# Altium footprint library 1.03-电容.PcbLib: 224 footprints (part 11 of 14)
Each footprint in its own frame and in the unit in brackets; x right, y up, seen from the top. Pads: shape width x height; smd on the part's side, far side on the other; paste and mask are expansions set on the pad; w line width, h text height; cw(c..) or ccw(c..) is an arc to the next point about the centre after c.
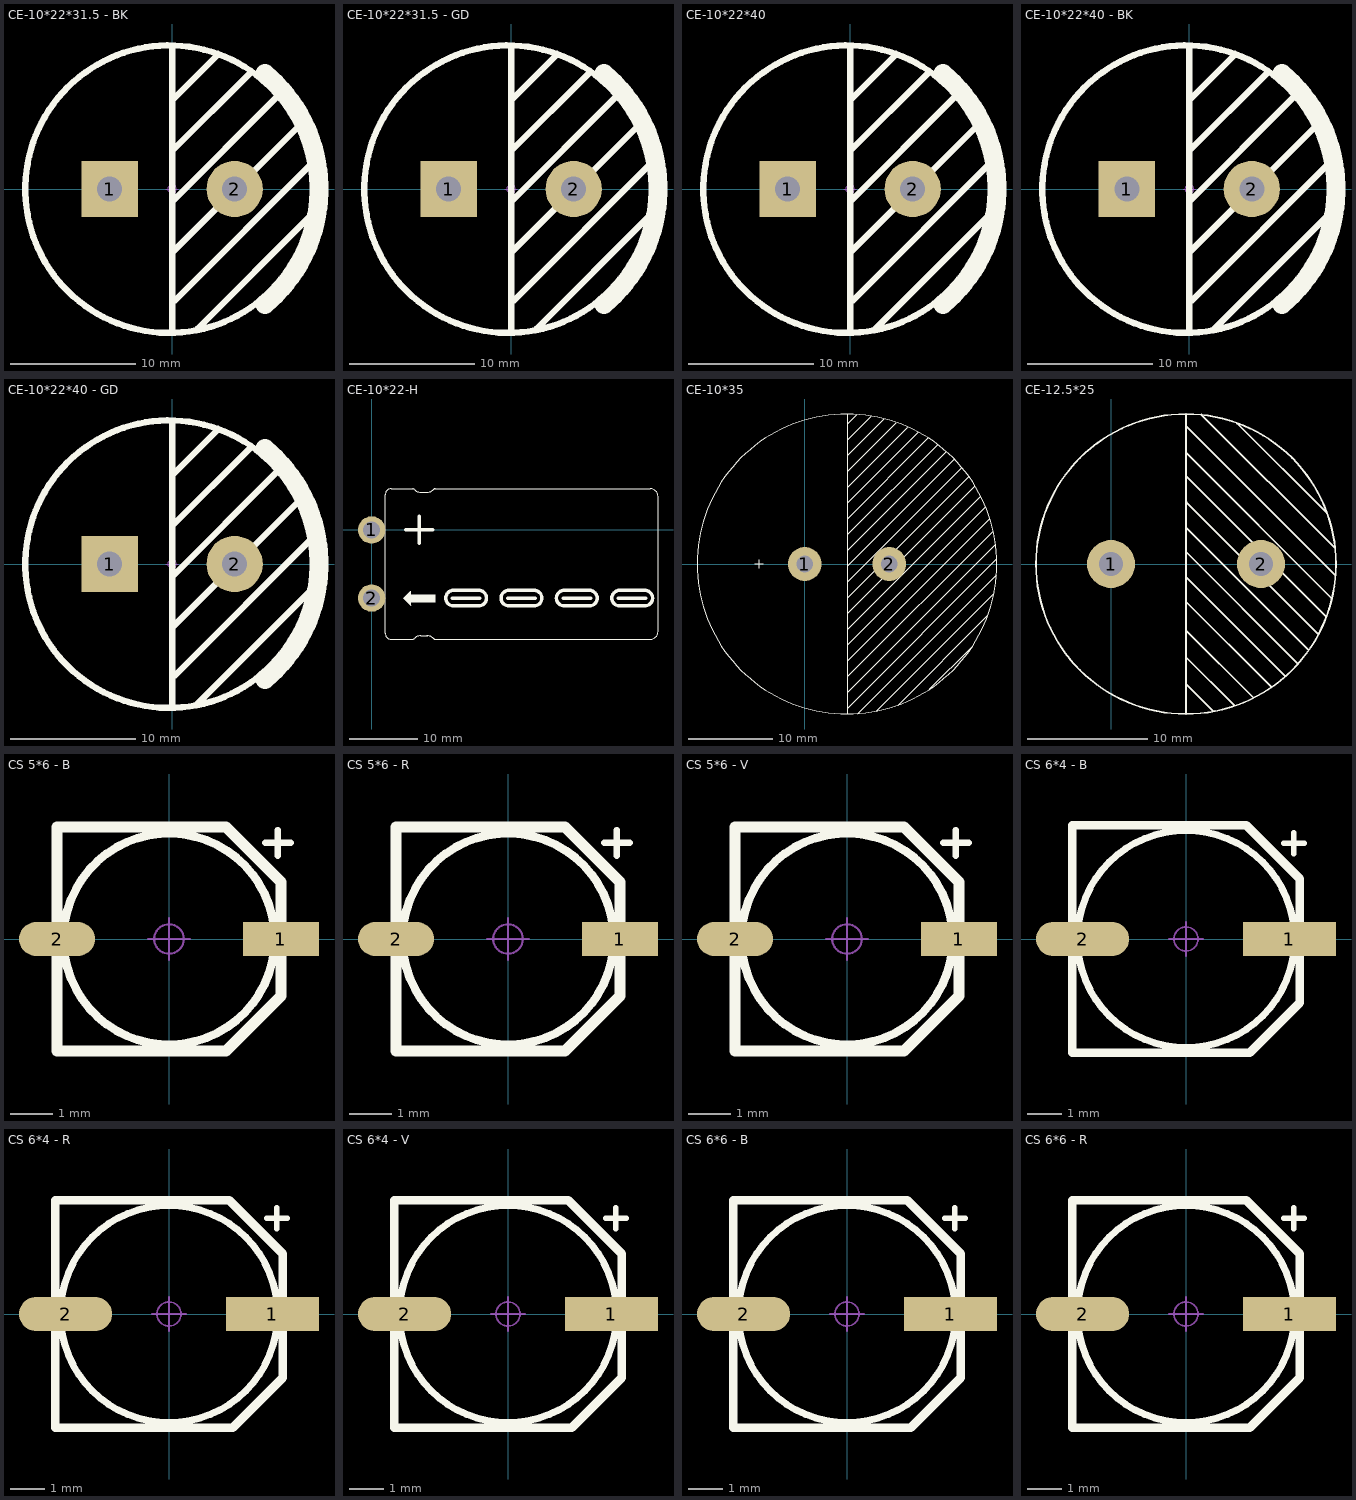
[diagram p10: the footprints below, top view; thin cyan lines are the x and y axes]

## CE-10*22*31.5 - BK [mm] "脚距10mm直径22mm高度31.5mm"
pads (2):
  rect 4.5x4.5 hole 2: 1(-5,0)
  round 4.5 hole 2: 2(5,0)
Top Overlay:
  circle w0.508: c-0.248,-0.013 r11.5
  lines w0.508: 0,-11.25 0,11.25 ; 0,-5.08 10.033,4.953 ; 0,-1.016 8.382,7.366 ; 0,3.048 6.223,9.271 ; 0,7.112 3.556,10.668 ; 0.254,-8.89 11.43,2.286 ; 2.032,-11.176 11.049,-2.159
  lines w1.524: 7.428,-9.219 ccw(c-0.254,0) 7.428,9.219
Mechanical 15:
  circle w0.05: c0,0 r0.35
  lines w0.05: -0.5,0 0.5,0 ; 0,-0.5 0,0.5
3D body "CE_TH_10x22x31_5.STEP": height 31.76, standoff -3.15, extent -11,-11.025 11.01,10.975

## CE-10*22*31.5 - GD [mm] "脚距10mm直径22mm高度31.5mm"
pads (2):
  rect 4.5x4.5 hole 2: 1(-5,0)
  round 4.5 hole 2: 2(5,0)
Top Overlay:
  circle w0.508: c-0.248,-0.013 r11.5
  lines w0.508: 0,-11.25 0,11.25 ; 0,-5.08 10.033,4.953 ; 0,-1.016 8.382,7.366 ; 0,3.048 6.223,9.271 ; 0,7.112 3.556,10.668 ; 0.254,-8.89 11.43,2.286 ; 2.032,-11.176 11.049,-2.159
  lines w1.524: 7.428,-9.219 ccw(c-0.254,0) 7.428,9.219
Mechanical 15:
  circle w0.05: c0,0 r0.35
  lines w0.05: -0.5,0 0.5,0 ; 0,-0.5 0,0.5
3D body "CE_TH_10x22x31_5-2.STEP": height 31.64, standoff -3.27, extent -11,-11 11.01,11

## CE-10*22*40 [mm] "脚距10mm直径22mm高度40mm"
pads (2):
  rect 4.5x4.5 hole 2: 1(-5,0)
  round 4.5 hole 2: 2(5,0)
Top Overlay:
  circle w0.508: c-0.248,-0.013 r11.5
  lines w0.508: 0,-11.25 0,11.25 ; 0,-5.08 10.033,4.953 ; 0,-1.016 8.382,7.366 ; 0,3.048 6.223,9.271 ; 0,7.112 3.556,10.668 ; 0.254,-8.89 11.43,2.286 ; 1.968,-11.239 11.049,-2.159
  lines w1.524: 7.428,-9.219 ccw(c-0.254,0) 7.428,9.219
Mechanical 15:
  circle w0.05: c0,0 r0.35
  lines w0.05: -0.5,0 0.5,0 ; 0,-0.5 0,0.5
3D body "cap_10x22x40-b.stp": height 40.14, standoff -3.27, extent -11,-10.999 11.01,10.999

## CE-10*22*40 - BK [mm] "脚距10mm直径22mm高度40mm"
pads (2):
  rect 4.5x4.5 hole 2: 1(-5,0)
  round 4.5 hole 2: 2(5,0)
Top Overlay:
  circle w0.508: c-0.256,-0.013 r11.5
  lines w0.508: -0.008,-11.25 -0.008,11.25 ; -0.008,-5.08 10.025,4.953 ; -0.008,-1.016 8.374,7.366 ; -0.008,3.048 6.215,9.271 ; -0.008,7.112 3.548,10.668 ; 0.246,-8.89 11.422,2.286 ; 1.96,-11.239 11.041,-2.159
  lines w1.524: 7.42,-9.219 ccw(c-0.262,0) 7.42,9.219
Mechanical 15:
  circle w0.05: c0,0 r0.35
  lines w0.05: -0.5,0 0.5,0 ; 0,-0.5 0,0.5
3D body "cap_10x22x40-BK.stp": height 40.14, standoff -3.32, extent -11.008,-10.998 11.002,10.999

## CE-10*22*40 - GD [mm] "脚距10mm直径22mm高度40mm"
pads (2):
  rect 4.5x4.5 hole 2: 1(-5,0)
  round 4.5 hole 2: 2(5,0)
Top Overlay:
  circle w0.508: c-0.248,-0.013 r11.5
  lines w0.508: 0,-11.25 0,11.25 ; 0,-5.08 10.033,4.953 ; 0,-1.016 8.382,7.366 ; 0,3.048 6.223,9.271 ; 0,7.112 3.556,10.668 ; 0.254,-8.89 11.43,2.286 ; 1.968,-11.239 11.049,-2.159
  lines w1.524: 7.428,-9.219 ccw(c-0.254,0) 7.428,9.219
Mechanical 15:
  circle w0.05: c0,0 r0.35
  lines w0.05: -0.5,0 0.5,0 ; 0,-0.5 0,0.5
3D body "gd.stp": height 40.14, standoff -3.27, extent -11,-10.998 11.01,10.999

## CE-10*22-H [mm] "联系卖家 免费查找封装"
pads (2):
  round 4 hole 2.5: 1(0,0) 2(0,-10)
Top Overlay:
  region: 9.312,-10.508 9.312,-9.492 8.296,-9.492 8.296,-10.508
  region: 9.058,-10.508 9.058,-9.492 5.756,-9.492 5.756,-10.508
  lines w0.1: 4.851,-10.111 4.851,-9.934 4.892,-9.893 ; 5.421,-10.681 5.421,-9.319 5.437,-9.303 ; 5.635,-9.105 5.645,-9.116 5.645,-10.905 ; 7.354,-15.525 8.102,-15.525 cw(c8.102,-16.935) 9.099,-15.938 ccw(c9.309,-15.728) 9.309,-16.025 40.894,-16.025 ccw(c40.894,-14.919) 42,-14.919 42,4.919 ccw(c40.894,4.919) 40.894,6.025 9.309,6.025 ccw(c9.309,5.728) 9.099,5.938 cw(c8.102,6.935) 8.102,5.525 7.354,5.525 ; 8.212,-15.525 7.207,-15.525 ccw(c7.207,-16.812) 6.297,-15.902 cw(c6,-15.605) 6,-16.025 2.845,-16.025 cw(c2.845,-15.191) 2.011,-15.191 2.011,5.191 cw(c2.845,5.191) 2.845,6.025 6,6.025 cw(c6,5.605) 6.297,5.902 ccw(c7.207,6.812) 7.207,5.525 8.212,5.525
  lines w0.15: 4.963,-10.223 4.963,-9.777 ; 5.097,-10.357 5.097,-9.643 ; 5.226,-10.486 5.226,-9.514 ; 5.365,-10.528 5.365,-9.375 ; 5.531,-10.778 5.531,-9.209 ; 5.756,-10.508 9.312,-10.508 9.312,-9.746 9.312,-9.492 5.756,-9.492 ; 4.74,-10 5.756,-11.016 5.756,-10.762 5.756,-8.984 4.74,-10
  lines w0.5: 4.98,0 6.98,0 ; 6.98,-2 6.98,0 ; 6.98,2 6.98,0 ; 8.98,0 6.98,0 ; 11.824,-10 15.884,-10 ; 19.944,-10 24.004,-10 ; 28.064,-10 32.124,-10 ; 36.184,-10 40.244,-10 ; 12,-11.136 cw(c12,-10) 12,-8.864 15.707,-8.864 cw(c15.707,-10) 15.707,-11.136 12,-11.136 ; 20.12,-11.136 cw(c20.12,-10) 20.12,-8.864 23.827,-8.864 cw(c23.827,-10) 23.827,-11.136 20.12,-11.136 ; 28.24,-11.136 cw(c28.24,-10) 28.24,-8.864 31.947,-8.864 cw(c31.947,-10) 31.947,-11.136 28.24,-11.136 ; 36.36,-11.136 cw(c36.36,-10) 36.36,-8.864 40.067,-8.864 cw(c40.067,-10) 40.067,-11.136 36.36,-11.136
3D body: height 11.08, standoff -5, extent -0.496,-0.499 0.5,0.499
3D body: height 11.58, standoff 10.58, extent -0.495,-0.498 0.5,0.498
3D body: height 11.58, standoff 10.58, extent -0.495,-10.498 0.5,-9.502
3D body: height 11.08, standoff -5, extent -0.496,-10.499 0.5,-9.501
3D body "22-10.STEP": height -0.5, standoff -22.5, extent 15.05,-16 42.05,6
3D body "22-10.STEP": height -0.5, standoff -22.5, extent -0.036,-16 26.964,6

## CE-10*35 [mm]
pads (2):
  round 4 hole 2: 1(0,0) 2(10,0)
Top Overlay:
  circle w0.1: c5,0 r17.75
  lines w0.1: -5.909,0.011 -4.893,0.011 ; -5.401,-0.497 -5.401,0.519 ; 5.074,-17.049 22.744,0.62 ; 5.077,-17.75 5.077,17.75 ; 5.077,-15.178 22.589,2.334 ; 5.077,-13.31 22.287,3.899 ; 5.077,-11.442 21.897,5.377 ; 5.077,-9.574 21.41,6.759 ; 5.077,-7.706 20.819,8.036 ; 5.077,-5.838 20.144,9.229 ; 5.077,-3.97 19.394,10.346 ; 5.077,-2.102 18.58,11.4 ; 5.077,-0.234 17.695,12.384 ; 5.077,1.634 16.732,13.289 ; 5.077,3.502 15.712,14.136 ; 5.077,5.37 14.621,14.913 ; 5.077,7.238 13.444,15.605 ; 5.077,9.106 12.176,16.204 ; 5.077,10.974 10.822,16.719 ; 5.077,12.842 9.411,17.176 ; 5.077,14.71 7.88,17.513 ; 5.077,16.578 6.183,17.684 ; 6.291,-17.7 22.705,-1.286 ; 8.463,-17.396 22.404,-3.455 ; 11.041,-16.687 21.678,-6.049 ; 14.817,-14.779 19.768,-9.828
3D body "User Library-CE_Assy.STEP": height 31, standoff -6.82, extent -12.43,-17.451 22.43,17.451

## CE-12.5*25 [mm] "淘宝ID:黄晶宝石   店铺网址:https://shop463601444.taobao.com"
pads (2):
  round 4 hole 2: 1(0,0) 2(12.5,0)
Top Overlay:
  lines w0.15: 6.224,-1.075 14.513,-9.364 ; 6.236,-3.122 13.301,-10.187 ; 6.238,-7.75 10.3,-11.812 ; 6.25,-12.5 6.25,12.5 ; 6.25,1.01 15.556,-8.297 ; 6.256,7.302 17.939,-4.38 ; 6.26,9.255 18.387,-2.872 ; 6.263,11.487 18.7,-0.95 ; 6.266,-10.012 8.494,-12.241 ; 6.268,3.025 16.391,-7.097 ; 6.276,-5.555 11.831,-11.109 ; 6.284,5.161 17.241,-5.796 ; 7.531,12.453 18.678,1.306 ; 10.501,11.719 18.005,4.214 ; 18.75,-0.013 cw(c6.25,0) 18.75,0
3D body "User Library-Cap 25x50.STEP": height 50.05, standoff -18.95, extent -6.25,-12.5 18.75,12.5

## CS 5*6 - B [mm] "直径5mm，高6mm"
pads (2):
  rect 1.8x0.8 smd: 1(2.65,0)
  oval 1.8x0.8 smd: 2(-2.65,0)
Top Overlay:
  circle w0.2: c0,0 r2.5
  lines w0.152: 2.279,2.275 2.879,2.275 ; 2.575,1.975 2.575,2.579
  lines w0.254: -2.65,-2.65 1.35,-2.65 2.65,-1.35 2.65,1.35 1.35,2.65 -2.65,2.65 -2.65,-2.65
Mechanical 15:
  circle w0.05: c0,0 r0.35
  lines w0.05: -0.5,0 0.5,0 ; 0,-0.5 0,0.5
3D body "CS_SMD_5x6-B.STEP": height 6.05, standoff 0.04, extent -2.95,-2.65 2.95,2.65

## CS 5*6 - R [mm] "直径5mm，高6mm"
pads (2):
  rect 1.8x0.8 smd: 1(2.65,0)
  oval 1.8x0.8 smd: 2(-2.65,0)
Top Overlay:
  circle w0.2: c0,0 r2.5
  lines w0.152: 2.279,2.275 2.879,2.275 ; 2.575,1.975 2.575,2.579
  lines w0.254: -2.65,-2.65 -2.65,2.65 1.35,2.65 2.65,1.35 2.65,-1.35 1.35,-2.65 -2.65,-2.65
Mechanical 15:
  circle w0.05: c0,0 r0.35
  lines w0.05: -0.5,0 0.5,0 ; 0,-0.5 0,0.5
3D body "CS_SMD_5x6-R.STEP": height 6.05, standoff 0.04, extent -2.95,-2.65 2.95,2.65

## CS 5*6 - V [mm] "直径5mm，高6mm"
pads (2):
  rect 1.8x0.8 smd: 1(2.65,0)
  oval 1.8x0.8 smd: 2(-2.65,0)
Top Overlay:
  circle w0.2: c0,0 r2.5
  lines w0.152: 2.279,2.275 2.879,2.275 ; 2.575,1.975 2.575,2.579
  lines w0.254: -2.65,-2.65 1.35,-2.65 2.65,-1.35 2.65,1.35 1.35,2.65 -2.65,2.65 -2.65,-2.65
Mechanical 15:
  circle w0.05: c0,0 r0.35
  lines w0.05: -0.5,0 0.5,0 ; 0,-0.5 0,0.5
3D body "CS_SMD_5x6-P.STEP": height 6.05, standoff 0.04, extent -2.95,-2.65 2.95,2.65

## CS 6*4 - B [mm] "直径6mm，高4mm"
pads (2):
  rect 2.7x1 smd: 1(3,0)
  oval 2.7x1 smd: 2(-3,0)
Top Overlay:
  circle w0.2: c0,0 r3.15
  lines w0.152: 2.829,2.775 3.429,2.775 ; 3.125,2.475 3.125,3.079
  lines w0.254: -3.3,-3.3 1.85,-3.3 3.3,-1.85 3.3,1.75 1.75,3.3 -3.3,3.3 -3.3,-3.3
Mechanical 15:
  circle w0.05: c0,0 r0.35
  lines w0.05: -0.5,0 0.5,0 ; 0,-0.5 0,0.5
3D body "CS_SMD_6x4-B.STEP": height 4.05, standoff 0.04, extent -3.5,-3.15 3.5,3.15

## CS 6*4 - R [mm] "直径6mm，高4mm"
pads (2):
  rect 2.7x1 smd: 1(3,0)
  oval 2.7x1 smd: 2(-3,0)
Top Overlay:
  circle w0.2: c0,0 r3.15
  lines w0.152: 2.829,2.775 3.429,2.775 ; 3.125,2.475 3.125,3.079
  lines w0.254: -3.3,-3.3 1.85,-3.3 3.3,-1.85 3.3,1.75 1.75,3.3 -3.3,3.3 -3.3,-3.3
Mechanical 15:
  circle w0.05: c0,0 r0.35
  lines w0.05: -0.5,0 0.5,0 ; 0,-0.5 0,0.5
3D body "CS_SMD_6x4-R.STEP": height 4.05, standoff 0.04, extent -3.5,-3.15 3.5,3.15

## CS 6*4 - V [mm] "直径6mm，高4mm"
pads (2):
  rect 2.7x1 smd: 1(3,0)
  oval 2.7x1 smd: 2(-3,0)
Top Overlay:
  circle w0.2: c0,0 r3.15
  lines w0.152: 2.829,2.775 3.429,2.775 ; 3.125,2.475 3.125,3.079
  lines w0.254: -3.3,-3.3 1.85,-3.3 3.3,-1.85 3.3,1.75 1.75,3.3 -3.3,3.3 -3.3,-3.3
Mechanical 15:
  circle w0.05: c0,0 r0.35
  lines w0.05: -0.5,0 0.5,0 ; 0,-0.5 0,0.5
3D body "CS_SMD_6x4-P.STEP": height 4.05, standoff 0.04, extent -3.5,-3.15 3.5,3.15

## CS 6*6 - B [mm] "直径6mm，高6mm                 联系卖家 免费查找封装"
pads (2):
  rect 2.7x1 smd: 1(3,0)
  oval 2.7x1 smd: 2(-3,0)
Top Overlay:
  circle w0.2: c0,0 r3.15
  lines w0.152: 2.829,2.775 3.429,2.775 ; 3.125,2.475 3.125,3.079
  lines w0.254: -3.3,-3.3 -3.3,3.3 1.75,3.3 3.3,1.75 3.3,-1.85 1.85,-3.3 -3.3,-3.3
Mechanical 15:
  circle w0.05: c0,0 r0.35
  lines w0.05: -0.5,0 0.5,0 ; 0,-0.5 0,0.5
3D body "CS_SMD_6x6-B.STEP": height 6.05, standoff 0.04, extent -3.5,-3.15 3.5,3.15

## CS 6*6 - R [mm] "直径6mm，高6mm                 联系卖家 免费查找封装"
pads (2):
  rect 2.7x1 smd: 1(3,0)
  oval 2.7x1 smd: 2(-3,0)
Top Overlay:
  circle w0.2: c0,0 r3.15
  lines w0.152: 2.829,2.775 3.429,2.775 ; 3.125,2.475 3.125,3.079
  lines w0.254: -3.3,-3.3 -3.3,3.3 1.75,3.3 3.3,1.75 3.3,-1.85 1.85,-3.3 -3.3,-3.3
Mechanical 15:
  circle w0.05: c0,0 r0.35
  lines w0.05: -0.5,0 0.5,0 ; 0,-0.5 0,0.5
3D body "CS_SMD_6x6-R.STEP": height 6.05, standoff 0.04, extent -3.5,-3.15 3.5,3.15